# Altium footprint library Circuitos Integrados.PcbLib: 81 footprints (part 1 of 6)
Each footprint in its own frame and in the unit in brackets; x right, y up, seen from the top. Pads: shape width x height; smd on the part's side, far side on the other; paste and mask are expansions set on the pad; w line width, h text height; cw(c..) or ccw(c..) is an arc to the next point about the centre after c.
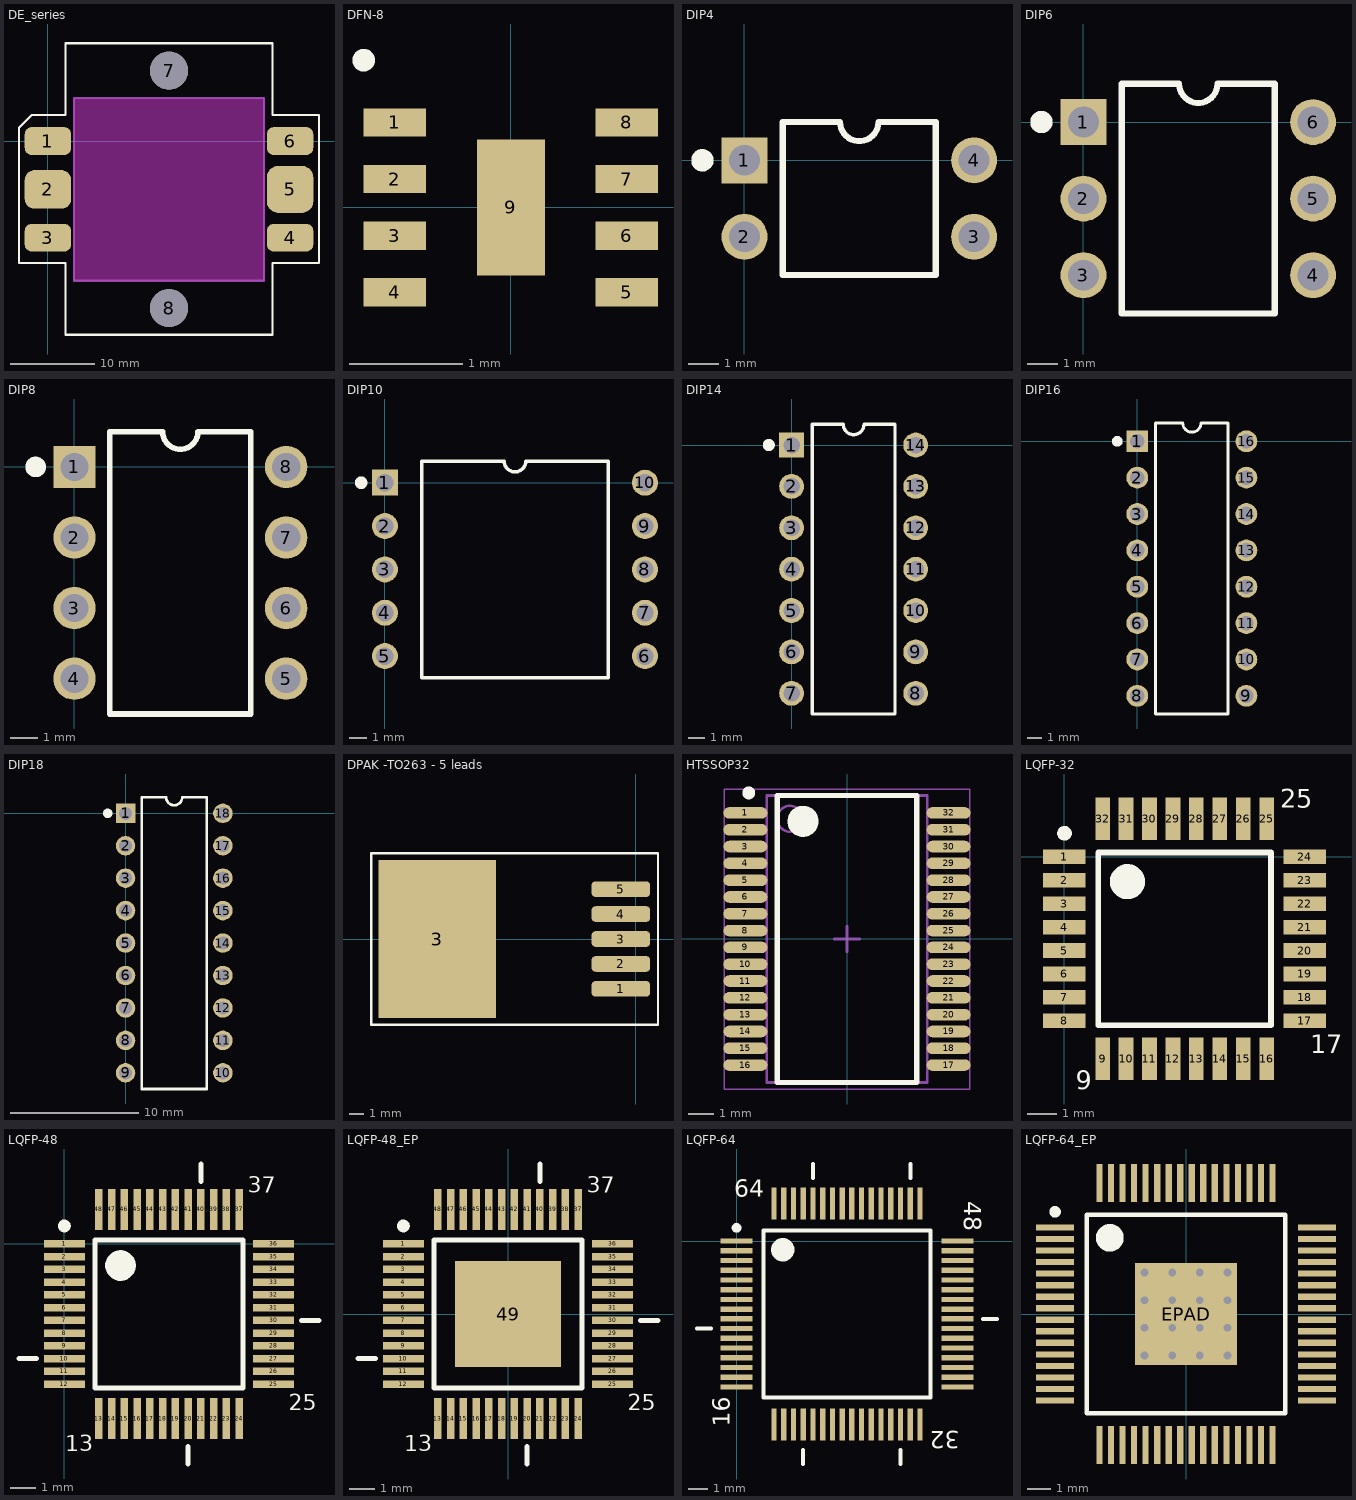
[diagram p0: the footprints below, top view; thin cyan lines are the x and y axes]

## DE_series [mm]
height 2.67
pads (8):
  rrect50% 5.5x3.3 smd: 1(0,0) 3(0,-11.43) 4(28.65,-11.43) 6(28.65,0)
  rrect50% 5.5x4.57 smd: 2(0,-5.715)
  rrect50% 5.5x5.59 smd: 5(28.65,-5.715)
  round 4.5 hole 4.5 unplated: 7(14.33,8.335) 8(14.33,-19.765)
Top Overlay:
  lines w0.254: -3.425,-14.415 -3.425,1.585 -1.925,3.085 2.075,3.085 2.075,6.085 2.075,11.585 26.075,11.585 26.575,11.585 26.575,3.085 32.075,3.085 32.075,-14.415 26.575,-14.415 26.575,-22.915 2.075,-22.915 2.075,-14.415 -3.425,-14.415
Keep-Out Layer:
  board cut-out: 3.075,5.085 25.575,5.085 25.575,-16.515 3.075,-16.515
Mechanical 1:
  lines w0.254: 3.075,-16.515 3.075,5.085 25.585,5.085 25.585,-16.515 3.075,-16.515
3D body: height 1.67, standoff -1, extent 6,-13.5 22.5,2

## DFN-8 [mm]
height 0.9
pads (9):
  rect 0.55x0.25 smd: 1(-1.025,0.75) 2(-1.025,0.25) 3(-1.025,-0.25) 4(-1.025,-0.75) 5(1.025,-0.75) 6(1.025,-0.25) 7(1.025,0.25) 8(1.025,0.75)
  rect 0.6x1.2 smd: 9(0,0)
Top Overlay:
  circle w0.1: c-1.3,1.3 r0.05
3D body: height 0.9, standoff 0, extent -1,-1 1,1

## DIP4 [mil]
pads (4):
  rect 60x60 hole 40: 1(0,0)
  round 60 hole 40: 2(0,-100) 3(300,-100) 4(300,0)
Top Overlay:
  circle w15: c-55,0 r7.07
  lines w8: 50,-150 250,-150 250,50 175,50 cw(c150,50) 125,50 50,50 50,-150
3D body "DIP4.STEP": height 169.69, standoff -129.13, extent -7.47,-159.05 307.49,59.06

## DIP6 [mil]
pads (6):
  rect 60x60 hole 40: 1(0,0)
  round 60 hole 40: 2(0,-100) 3(0,-200) 4(300,-200) 5(300,-100) 6(300,0)
Top Overlay:
  circle w15: c-55,0 r7.07
  lines w8: 50,-250 50,50 125,50 ccw(c150,50) 175,50 250,50 250,-250 50,-250
3D body "DIP6.STEP": height 169.69, standoff -129.13, extent -7.48,-259.05 307.49,59.06

## DIP8 [mil]
height 100
pads (8):
  rect 60x60 hole 40: 1(0,0)
  round 60 hole 40: 2(0,-100) 3(0,-200) 4(0,-300) 5(300,-300) 6(300,-200) 7(300,-100) 8(300,0)
Top Overlay:
  circle w15: c-55,0 r7.07
  lines w8: 50,-350 250,-350 250,50 175,50 cw(c150,50) 125,50 50,50 50,-350
3D body "DIP8.STEP": height 200, standoff -137.8, extent -4.92,-359.84 304.93,70.09

## DIP10 [mil]
pads (10):
  rect 60x60 hole 40: 1(0,0)
  round 60 hole 40: 2(0,-100) 3(0,-200) 4(0,-300) 5(0,-400) 6(600,-400) 7(600,-300) 8(600,-200) 9(600,-100) 10(600,0)
Top Overlay:
  circle w15: c-55,0 r7.07
  lines w8: 85,-450 515,-450 515,50 325,50 cw(c300,50) 275,50 85,50 85,-450

## DIP14 [mil]
pads (14):
  rect 60x60 hole 40: 1(0,0)
  round 60 hole 40: 2(0,-100) 3(0,-200) 4(0,-300) 5(0,-400) 6(0,-500) 7(0,-600) 8(300,-600) 9(300,-500) 10(300,-400) 11(300,-300) 12(300,-200) 13(300,-100) 14(300,0)
Top Overlay:
  circle w15: c-55,0 r7.07
  lines w8: 50,-650 250,-650 250,50 175,50 cw(c150,50) 125,50 50,50 50,-650
3D body "DIP14.STEP": height 144.88, standoff -129.92, extent -5.7,-674.99 309.26,75.01

## DIP16 [mil]
pads (16):
  rect 60x60 hole 40: 1(0,0)
  round 60 hole 40: 2(0,-100) 3(0,-200) 4(0,-300) 5(0,-400) 6(0,-500) 7(0,-600) 8(0,-700) 9(300,-700) 10(300,-600) 11(300,-500) 12(300,-400) 13(300,-300) 14(300,-200) 15(300,-100) 16(300,0)
Top Overlay:
  circle w15: c-55,0 r7.07
  lines w8: 50,-750 50,50 125,50 ccw(c150,50) 175,50 250,50 250,-750 50,-750
3D body "DIP16.STEP": height 200.79, standoff -129.92, extent -4.91,-737.4 304.93,50

## DIP18 [mil]
pads (18):
  rect 60x60 hole 40: 1(0,0)
  round 60 hole 40: 2(0,-100) 3(0,-200) 4(0,-300) 5(0,-400) 6(0,-500) 7(0,-600) 8(0,-700) 9(0,-800) 10(300,-800) 11(300,-700) 12(300,-600) 13(300,-500) 14(300,-400) 15(300,-300) 16(300,-200) 17(300,-100) 18(300,0)
Top Overlay:
  circle w15: c-55,0 r7.07
  lines w8: 50,-850 250,-850 250,50 175,50 cw(c150,50) 125,50 50,50 50,-850
3D body "User Library-DIP18-300.step": height 200, standoff -98.03, extent -4.92,-852.57 304.92,52.55

## DPAK -TO263 - 5 leads [mil]
pads (6):
  rrect50% 157.48x42 smd: 1(-39.69,-134) 2(-39.69,-67) 3(-39.69,0) 4(-39.69,67) 5(-39.69,134)
  rect 314.96x425 smd: 3(-533,0)
Top Overlay:
  lines w6: -710,-230 -710,230 60,230 60,-230 -710,-230
3D body "SW3dPS-TO263-5.STEP": height 196.17, standoff 7.19, extent -617.32,-196.84 -0.39,196.86

## HTSSOP32 [mm] "TSOP, 32-Leads, Body 11,00x6,10mm, Pitch 0,65mm, IPC Medium Density"
height 1.1
pads (32):
  oval 1.7x0.45 smd: 1(-3.927,4.875) 2(-3.927,4.225) 3(-3.927,3.575) 4(-3.927,2.925) 5(-3.927,2.275) 6(-3.927,1.625) 7(-3.927,0.975) 8(-3.927,0.325) 9(-3.927,-0.325) 10(-3.927,-0.975) 11(-3.927,-1.625) 12(-3.927,-2.275) 13(-3.927,-2.925) 14(-3.927,-3.575) 15(-3.927,-4.225) 16(-3.927,-4.875) 17(3.927,-4.875) 18(3.927,-4.225) 19(3.927,-3.575) 20(3.927,-2.925) 21(3.927,-2.275) 22(3.927,-1.625) 23(3.927,-0.975) 24(3.927,-0.325) 25(3.927,0.325) 26(3.927,0.975) 27(3.927,1.625) 28(3.927,2.275) 29(3.927,2.925) 30(3.927,3.575) 31(3.927,4.225) 32(3.927,4.875)
Top Overlay:
  circle w0.6: c-1.7,4.55 r0.3
  circle w0.25: c-3.8,5.65 r0.125
  lines w0.2: -2.7,-5.55 2.7,-5.55 2.7,5.55 -2.7,5.55 -2.7,-5.55
Mechanical 13:
  circle w0.1: c-2.2,4.65 r0.5
  lines w0.1: -3.1,-5.55 3.1,-5.55 3.1,5.55 -3.1,5.55 -3.1,-5.55
Mechanical 15:
  lines w0.05: -4.75,-5.8 4.75,-5.8 4.75,5.8 -4.75,5.8 -4.75,-5.8
  lines w0.1: -0.5,0 0.5,0 ; 0,-0.5 0,0.5
3D body "HTSSOP32.step": height 1.08, standoff -0.02, extent -3.982,-5.599 4.236,5.501

## LQFP-32 [mm] "TQFP, 32-Leads, Body 9,1x9,1mm (max), Pitch 0,80mm, IPC Medium Density"
height 1.6
pads (32):
  rect 1.45x0.5 smd: 1(0,0) 2(0,-0.8) 3(0,-1.6) 4(0,-2.4) 5(0,-3.2) 6(0,-4) 7(0,-4.8) 8(0,-5.6) 17(8.2,-5.6) 18(8.2,-4.8) 19(8.2,-4) 20(8.2,-3.2) 21(8.2,-2.4) 22(8.2,-1.6) 23(8.2,-0.8) 24(8.2,0)
  rect 0.5x1.45 smd: 9(1.3,-6.9) 10(2.1,-6.9) 11(2.9,-6.9) 12(3.7,-6.9) 13(4.5,-6.9) 14(5.3,-6.9) 15(6.1,-6.9) 16(6.9,-6.9) 25(6.9,1.3) 26(6.1,1.3) 27(5.3,1.3) 28(4.5,1.3) 29(3.7,1.3) 30(2.9,1.3) 31(2.1,1.3) 32(1.3,1.3)
Top Overlay:
  circle w0.25: c0,0.8 r0.125
  circle w0.6: c2.15,-0.85 r0.3
  lines w0.2: 1.15,-5.75 1.15,0.15 7.05,0.15 7.05,-5.75 1.15,-5.75
  text "9" at 0.381,-7.925 h0.64
  text "17" at 8.382,-6.706 h0.64
  text "25" at 7.366,1.676 h0.64
3D body "User Library-lqfp32-1.STEP": height 1.5, standoff 0.02, extent -0.406,-7.294 8.594,1.706

## LQFP-48 [mm] "LQFP, 48-Leads, Body 9,3x9,3mm (max), Pitch 0,50mm, IPC Medium Density"
height 1.4
pads (48):
  rect 1.6x0.3 smd: 1(0,0) 2(0,-0.5) 3(0,-1) 4(0,-1.5) 5(0,-2) 6(0,-2.5) 7(0,-3) 8(0,-3.5) 9(0,-4) 10(0,-4.5) 11(0,-5) 12(0,-5.5) 25(8.2,-5.5) 26(8.2,-5) 27(8.2,-4.5) 28(8.2,-4) 29(8.2,-3.5) 30(8.2,-3) 31(8.2,-2.5) 32(8.2,-2) 33(8.2,-1.5) 34(8.2,-1) 35(8.2,-0.5) 36(8.2,0)
  rect 0.3x1.6 smd: 13(1.35,-6.85) 14(1.85,-6.85) 15(2.35,-6.85) 16(2.85,-6.85) 17(3.35,-6.85) 18(3.85,-6.85) 19(4.35,-6.85) 20(4.85,-6.85) 21(5.35,-6.85) 22(5.85,-6.85) 23(6.35,-6.85) 24(6.85,-6.85) 37(6.85,1.35) 38(6.35,1.35) 39(5.85,1.35) 40(5.35,1.35) 41(4.85,1.35) 42(4.35,1.35) 43(3.85,1.35) 44(3.35,1.35) 45(2.85,1.35) 46(2.35,1.35) 47(1.85,1.35) 48(1.35,1.35)
Top Overlay:
  circle w0.6: c2.2,-0.85 r0.3
  circle w0.25: c0,0.7 r0.125
  lines w0.2: 1.2,-5.65 7,-5.65 7,0.15 1.2,0.15 1.2,-5.65
  lines w0.203: -1.778,-4.496 -1.092,-4.496 ; 4.846,-8.628 4.846,-7.942 ; 5.354,2.442 5.354,3.128 ; 9.292,-3.004 9.978,-3.004
  text "13" at 0.025,-8.128 h0.64
  text "25" at 8.788,-6.528 h0.64
  text "37" at 7.188,2.007 h0.64
3D body "SW3dPS-LQFP48.STEP": height 1.5, standoff 0, extent -0.389,-7.243 8.611,1.757

## LQFP-48_EP [mm] "LQFP, 48-Leads, Body 9,3x9,3mm (max), Pitch 0,50mm, IPC Medium Density"
height 1.4
pads (49):
  rect 1.6x0.3 smd: 1(-4.1,2.75) 2(-4.1,2.25) 3(-4.1,1.75) 4(-4.1,1.25) 5(-4.1,0.75) 6(-4.1,0.25) 7(-4.1,-0.25) 8(-4.1,-0.75) 9(-4.1,-1.25) 10(-4.1,-1.75) 11(-4.1,-2.25) 12(-4.1,-2.75) 25(4.1,-2.75) 26(4.1,-2.25) 27(4.1,-1.75) 28(4.1,-1.25) 29(4.1,-0.75) 30(4.1,-0.25) 31(4.1,0.25) 32(4.1,0.75) 33(4.1,1.25) 34(4.1,1.75) 35(4.1,2.25) 36(4.1,2.75)
  rect 0.3x1.6 smd: 13(-2.75,-4.1) 14(-2.25,-4.1) 15(-1.75,-4.1) 16(-1.25,-4.1) 17(-0.75,-4.1) 18(-0.25,-4.1) 19(0.25,-4.1) 20(0.75,-4.1) 21(1.25,-4.1) 22(1.75,-4.1) 23(2.25,-4.1) 24(2.75,-4.1) 37(2.75,4.1) 38(2.25,4.1) 39(1.75,4.1) 40(1.25,4.1) 41(0.75,4.1) 42(0.25,4.1) 43(-0.25,4.1) 44(-0.75,4.1) 45(-1.25,4.1) 46(-1.75,4.1) 47(-2.25,4.1) 48(-2.75,4.1)
  rect 4.15x4.15 smd paste-1000: 49(0,0)
Top Overlay:
  circle w0.25: c-4.1,3.45 r0.125
  lines w0.2: -2.9,-2.9 -2.9,2.9 2.9,2.9 2.9,-2.9 -2.9,-2.9
  lines w0.203: -5.878,-1.746 -5.192,-1.746 ; 0.746,-5.878 0.746,-5.192 ; 1.254,5.192 1.254,5.878 ; 5.192,-0.254 5.878,-0.254
  text "37" at 3.088,4.757 h0.64
  text "25" at 4.688,-3.778 h0.64
  text "13" at -4.075,-5.378 h0.64
Top Paste:
  circle w0.2: c-1.722,1.524 r0.1
  circle w0.2: c-1.037,1.524 r0.1
  circle w0.2: c-0.352,1.524 r0.1
  circle w0.2: c0.333,1.524 r0.1
  circle w0.2: c1.018,1.524 r0.1
  circle w0.2: c1.703,1.524 r0.1
  circle w0.2: c-1.722,0.925 r0.1
  circle w0.2: c-1.037,0.925 r0.1
  circle w0.2: c-0.352,0.925 r0.1
  circle w0.2: c0.333,0.925 r0.1
  circle w0.2: c1.018,0.925 r0.1
  circle w0.2: c1.703,0.925 r0.1
  circle w0.2: c-1.722,0.325 r0.1
  circle w0.2: c-1.037,0.325 r0.1
  circle w0.2: c-0.352,0.325 r0.1
  circle w0.2: c0.333,0.325 r0.1
  circle w0.2: c1.018,0.325 r0.1
  circle w0.2: c1.703,0.325 r0.1
  circle w0.2: c-1.722,-0.274 r0.1
  circle w0.2: c-1.037,-0.274 r0.1
  circle w0.2: c-0.352,-0.274 r0.1
  circle w0.2: c0.333,-0.274 r0.1
  circle w0.2: c1.018,-0.274 r0.1
  circle w0.2: c1.703,-0.274 r0.1
  circle w0.2: c1.703,-0.874 r0.1
  circle w0.2: c1.018,-0.874 r0.1
  circle w0.2: c0.333,-0.874 r0.1
  circle w0.2: c-0.352,-0.874 r0.1
  circle w0.2: c-1.037,-0.874 r0.1
  circle w0.2: c-1.722,-0.874 r0.1
  circle w0.2: c-1.722,-1.473 r0.1
  circle w0.2: c-1.037,-1.473 r0.1
  circle w0.2: c-0.352,-1.473 r0.1
  circle w0.2: c0.333,-1.473 r0.1
  circle w0.2: c1.018,-1.473 r0.1
  circle w0.2: c1.703,-1.473 r0.1
3D body "SW3dPS-LQFP48.STEP": height 1.5, standoff 0, extent -4.489,-4.493 4.511,4.507

## LQFP-64 [mm] "LQFP, 64-Leads, Body 12,2x12,2mm (max), Pitch 0,50mm, IPC Medium Density"
height 1.6
pads (64):
  rect 1.65x0.27 smd: 1(0,0) 2(0,-0.5) 3(0,-1) 4(0,-1.5) 5(0,-2) 6(0,-2.5) 7(0,-3) 8(0,-3.5) 9(0,-4) 10(0,-4.5) 11(0,-5) 12(0,-5.5) 13(0,-6) 14(0,-6.5) 15(0,-7) 16(0,-7.5) 33(11.35,-7.5) 34(11.35,-7) 35(11.35,-6.5) 36(11.35,-6) 37(11.35,-5.5) 38(11.35,-5) 39(11.35,-4.5) 40(11.35,-4) 41(11.35,-3.5) 42(11.35,-3) 43(11.35,-2.5) 44(11.35,-2) 45(11.35,-1.5) 46(11.35,-1) 47(11.35,-0.5) 48(11.35,0)
  rect 0.27x1.65 smd: 17(1.925,-9.425) 18(2.425,-9.425) 19(2.925,-9.425) 20(3.425,-9.425) 21(3.925,-9.425) 22(4.425,-9.425) 23(4.925,-9.425) 24(5.425,-9.425) 25(5.925,-9.425) 26(6.425,-9.425) 27(6.925,-9.425) 28(7.425,-9.425) 29(7.925,-9.425) 30(8.425,-9.425) 31(8.925,-9.425) 32(9.425,-9.425) 49(9.425,1.925) 50(8.925,1.925) 51(8.425,1.925) 52(7.925,1.925) 53(7.425,1.925) 54(6.925,1.925) 55(6.425,1.925) 56(5.925,1.925) 57(5.425,1.925) 58(4.925,1.925) 59(4.425,1.925) 60(3.925,1.925) 61(3.425,1.925) 62(2.925,1.925) 63(2.425,1.925) 64(1.925,1.925)
Top Overlay:
  circle w0.6: c2.375,-0.45 r0.3
  circle w0.25: c0,0.677 r0.125
  lines w0.2: 1.375,-8.05 9.975,-8.05 9.975,0.55 1.375,0.55 1.375,-8.05
  lines w0.203: -2.032,-4.496 -1.321,-4.496 ; 3.421,-11.457 3.421,-10.746 ; 3.929,3.246 3.929,3.957 ; 8.421,-11.457 8.421,-10.746 ; 8.929,3.246 8.929,3.957 ; 12.671,-4.004 13.382,-4.004
  text "64" at -0.127,2.286 h0.89
  text "48" at 11.711,2.052 h0.89
  text "32" at 11.477,-9.786 h0.89
  text "16" at -0.361,-9.552 h0.89
3D body "lqpf64.STEP": height 1.5, standoff 0.02, extent -0.325,-9.75 11.675,2.25

## LQFP-64_EP [mm] "LQFP, 64-Leads, Body 12,2x12,2mm (max), Pitch 0,50mm, IPC Medium Density"
height 1.6
pads (65):
  rect 1.65x0.27 smd: 1(-5.675,3.75) 2(-5.675,3.25) 3(-5.675,2.75) 4(-5.675,2.25) 5(-5.675,1.75) 6(-5.675,1.25) 7(-5.675,0.75) 8(-5.675,0.25) 9(-5.675,-0.25) 10(-5.675,-0.75) 11(-5.675,-1.25) 12(-5.675,-1.75) 13(-5.675,-2.25) 14(-5.675,-2.75) 15(-5.675,-3.25) 16(-5.675,-3.75) 33(5.675,-3.75) 34(5.675,-3.25) 35(5.675,-2.75) 36(5.675,-2.25) 37(5.675,-1.75) 38(5.675,-1.25) 39(5.675,-0.75) 40(5.675,-0.25) 41(5.675,0.25) 42(5.675,0.75) 43(5.675,1.25) 44(5.675,1.75) 45(5.675,2.25) 46(5.675,2.75) 47(5.675,3.25) 48(5.675,3.75)
  rect 0.27x1.65 smd: 17(-3.75,-5.675) 18(-3.25,-5.675) 19(-2.75,-5.675) 20(-2.25,-5.675) 21(-1.75,-5.675) 22(-1.25,-5.675) 23(-0.75,-5.675) 24(-0.25,-5.675) 25(0.25,-5.675) 26(0.75,-5.675) 27(1.25,-5.675) 28(1.75,-5.675) 29(2.25,-5.675) 30(2.75,-5.675) 31(3.25,-5.675) 32(3.75,-5.675) 49(3.75,5.675) 50(3.25,5.675) 51(2.75,5.675) 52(2.25,5.675) 53(1.75,5.675) 54(1.25,5.675) 55(0.75,5.675) 56(0.25,5.675) 57(-0.25,5.675) 58(-0.75,5.675) 59(-1.25,5.675) 60(-1.75,5.675) 61(-2.25,5.675) 62(-2.75,5.675) 63(-3.25,5.675) 64(-3.75,5.675)
  rect 4.4x4.4 smd paste-900: EPAD(0,0)
via 1.8,-1.8 diameter 0.66 hole 0.33
via 0.6,-1.8 diameter 0.66 hole 0.33
via -0.6,-1.8 diameter 0.66 hole 0.33
via -1.8,-1.8 diameter 0.66 hole 0.33
via 1.8,-0.6 diameter 0.66 hole 0.33
via 0.6,-0.6 diameter 0.66 hole 0.33
via -0.6,-0.6 diameter 0.66 hole 0.33
via -1.8,-0.6 diameter 0.66 hole 0.33
via 1.8,0.6 diameter 0.66 hole 0.33
via 0.6,0.6 diameter 0.66 hole 0.33
via -0.6,0.6 diameter 0.66 hole 0.33
via -1.8,0.6 diameter 0.66 hole 0.33
via 1.8,1.8 diameter 0.66 hole 0.33
via 0.6,1.8 diameter 0.66 hole 0.33
via -0.6,1.8 diameter 0.66 hole 0.33
via -1.8,1.8 diameter 0.66 hole 0.33
Top Overlay:
  circle w0.6: c-3.3,3.3 r0.3
  circle w0.25: c-5.675,4.427 r0.125
  lines w0.2: -4.3,-4.3 4.3,-4.3 4.3,4.3 -4.3,4.3 -4.3,-4.3
Top Paste:
  rectangle: -1.8,0.6 -0.6,1.8
  rectangle: -0.6,-0.6 0.6,0.6
  rectangle: 0.6,-1.8 1.8,-0.6
  rectangle: 0.6,0.6 1.8,1.8
  rectangle: -1.8,-1.8 -0.6,-0.6
3D body "lqpf64.STEP": height 1.5, standoff 0.02, extent -6,-6 6,6